# Altium schematic symbol library IC.SchLib: 555 symbols (part 4 of 15)
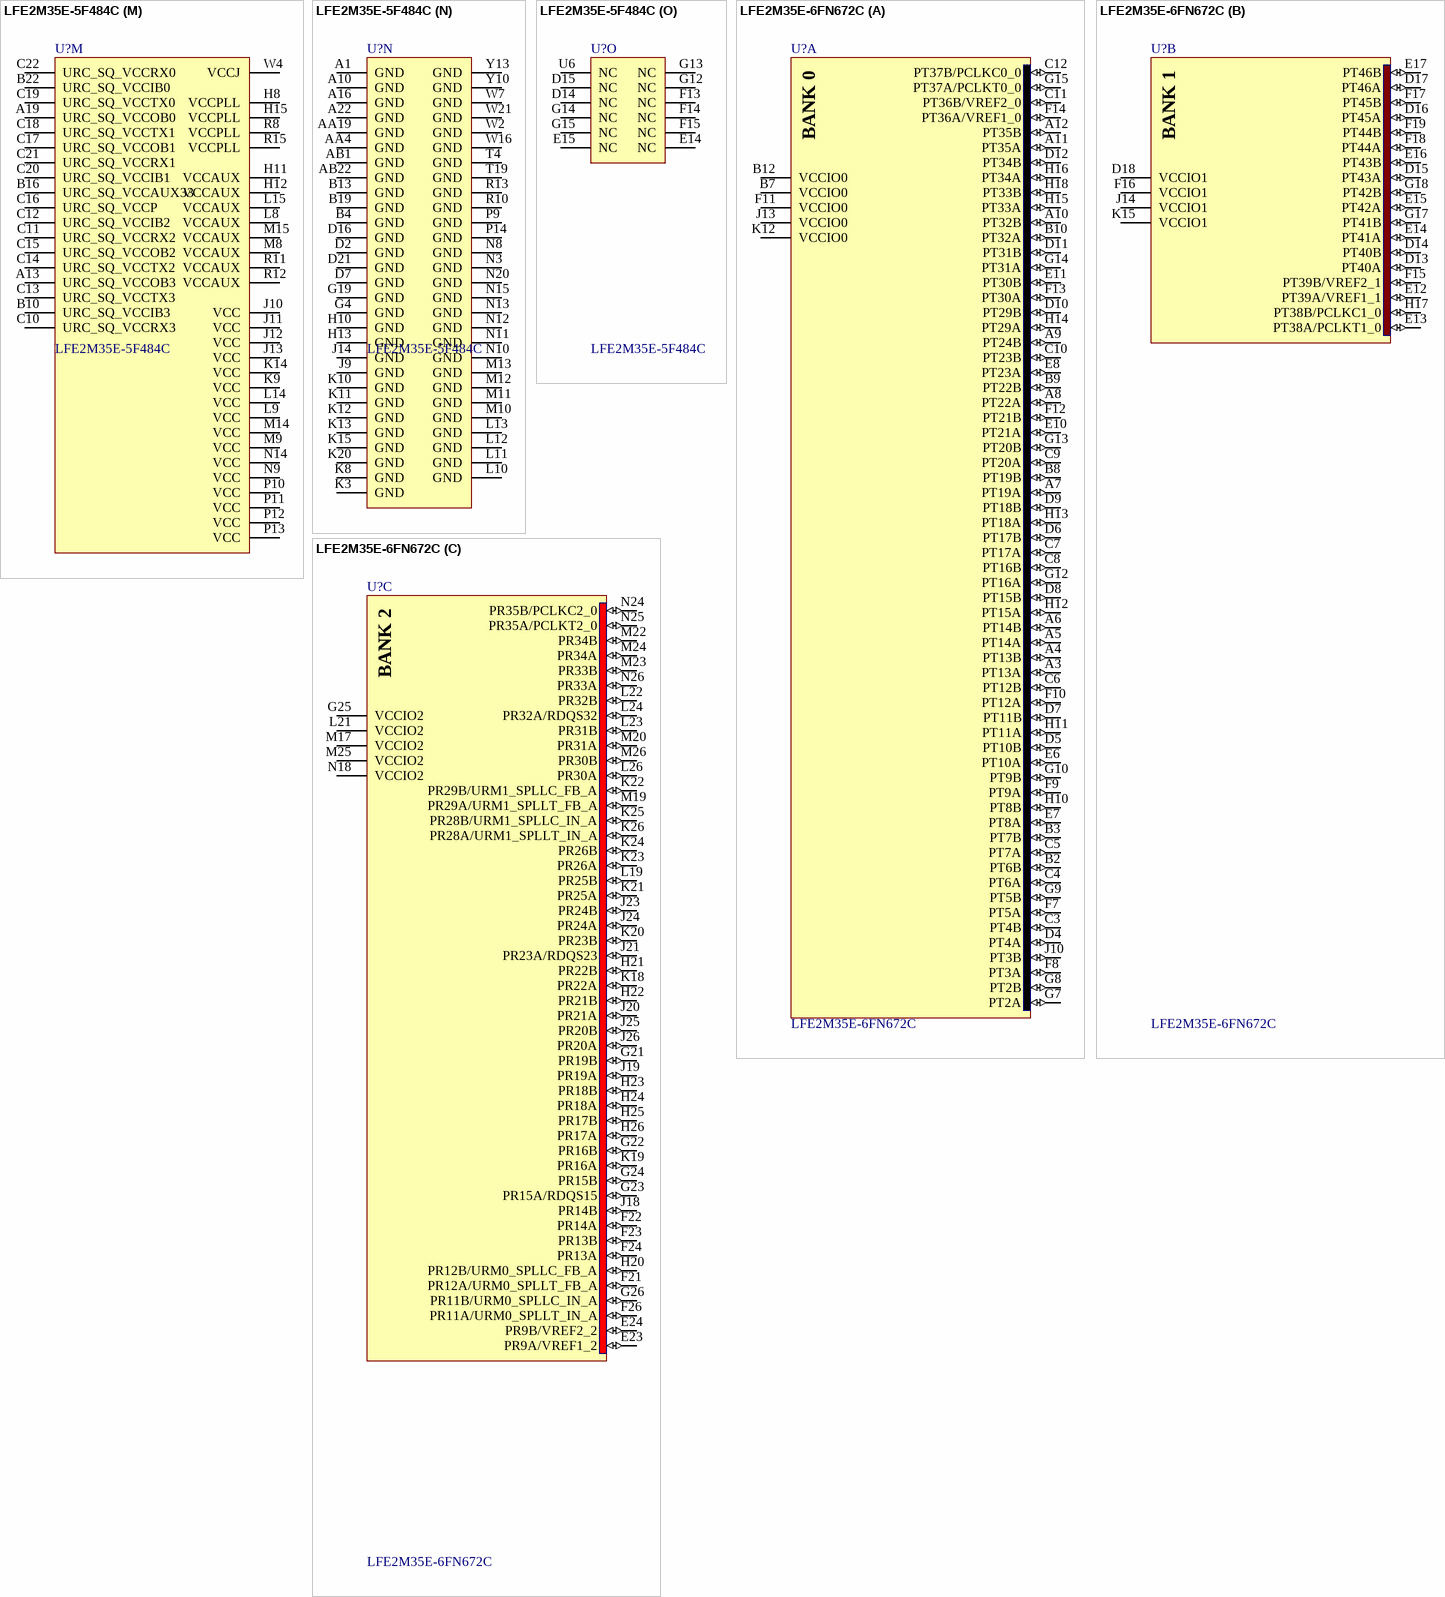
[diagram p73: symbols LFE2M35E-5F484C to LFE2M35E-6FN672C]

## LFE2M35E-5F484C
designator U?
ECP2M 1.2V  FPGA, 303 I/Os, 35K LUTs, 484-Ball fpBGA, Speed Grade 5, Commercial Grade; Manufacturer: Lattice; Tech: SMDR; Sort: 510; Package: FPBGA484; Price: 0; Manufacturer No: LFE2M35E-5F484C
footprint fpBGA484 (484-Ball Fine Pitch Ball Grid Array (fpBGA484))
3D model LFE2M35E_F484 (484-Ball Fine Pitch Ball Grid Array (fpBGA484))
part A pins: A2 PT35B (io) "General-purpose user-I/O pin.", A3 PT35A (io) "General-purpose user-I/O pin.", B1 PT2B (io) "General-purpose user-I/O pin.", B2 PT3A (io) "General-purpose user-I/O pin.", B3 PT34B (io) "General-purpose user-I/O pin.", B5 VCCIO0 (power) "Dedicated power supply pin for I/O bank.", B6 PT32A (io) "General-purpose user-I/O pin.", B9 VCCIO0 (power) "Dedicated power supply pin for I/O bank.", C1 PT2A (io) "General-purpose user-I/O pin.", C2 PT3B (io) "General-purpose user-I/O pin.", C3 PT8B (io) "General-purpose user-I/O pin.", C4 PT34A (io) "General-purpose user-I/O pin.", C5 PT31A (io) "General-purpose user-I/O pin.", C6 PT31B (io) "General-purpose user-I/O pin.", C7 PT32B (io) "General-purpose user-I/O pin.", C8 PT30B (io) "General-purpose user-I/O pin.", C9 PT36B/VREF2_0 (io) "Dual-purpose pin that is either a user-I/O pin or provides a reference voltage input for I/O bank.", D3 PT5B (io) "General-purpose user-I/O pin.", D4 PT8A (io) "General-purpose user-I/O pin.", D5 PT4B (io) "General-purpose user-I/O pin.", D6 PT6A (io) "General-purpose user-I/O pin.", D8 PT30A (io) "General-purpose user-I/O pin.", D9 PT36A/VREF1_0 (io) "Dual-purpose pin that is either a user-I/O pin or provides a reference voltage input for I/O bank.", E3 PT5A (io) "General-purpose user-I/O pin.", E4 PT4A (io) "General-purpose user-I/O pin.", E5 PT6B (io) "General-purpose user-I/O pin.", E6 PT7A (io) "General-purpose user-I/O pin.", E7 VCCIO0 (power) "Dedicated power supply pin for I/O bank.", E8 PT29B (io) "General-purpose user-I/O pin.", E9 PT29A (io) "General-purpose user-I/O pin.", E10 PT33B (io) "General-purpose user-I/O pin.", F6 PT7B (io) "General-purpose user-I/O pin.", F7 PT9B (io) "General-purpose user-I/O pin.", F8 PT10B (io) "General-purpose user-I/O pin.", F9 PT37A/PCLKT0_0 (io) "Dual-purpose pin that is either a user-I/O pin or Primary Clock pin.", F10 PT33A (io) "General-purpose user-I/O pin.", G7 PT9A (io) "General-purpose user-I/O pin.", G8 PT10A (io) "General-purpose user-I/O pin.", G9 PT37B/PCLKC0_0 (io) "Dual-purpose pin that is either a user-I/O pin or Primary Clock pin.", H9 VCCIO0 (power) "Dedicated power supply pin for I/O bank."
part B pins: A4 PT42A (io) "General-purpose user-I/O pin.", A5 PT42B (io) "General-purpose user-I/O pin.", A6 PT44A (io) "General-purpose user-I/O pin.", A7 PT44B (io) "General-purpose user-I/O pin.", A8 PT45A (io) "General-purpose user-I/O pin.", A9 PT45B (io) "General-purpose user-I/O pin.", B7 PT41B (io) "General-purpose user-I/O pin.", B8 PT41A (io) "General-purpose user-I/O pin.", D10 PT39A/VREF1_1 (io) "Dual-purpose pin that is either a user-I/O pin or provides a reference voltage input for I/O bank.", D11 PT39B/VREF2_1 (io) "Dual-purpose pin that is either a user-I/O pin or provides a reference voltage input for I/O bank.", D12 PT46A (io) "General-purpose user-I/O pin.", D13 VCCIO1 (power) "Dedicated power supply pin for I/O bank.", E11 PT40A (io) "General-purpose user-I/O pin.", E12 PT43B (io) "General-purpose user-I/O pin.", E13 PT46B (io) "General-purpose user-I/O pin.", E16 VCCIO1 (power) "Dedicated power supply pin for I/O bank.", F11 PT38A/PCLKT1_0 (io) "Dual-purpose pin that is either a user-I/O pin or Primary Clock pin.", F12 PT43A (io) "General-purpose user-I/O pin.", G10 PT38B/PCLKC1_0 (io) "Dual-purpose pin that is either a user-I/O pin or Primary Clock pin.", G11 PT40B (io) "General-purpose user-I/O pin.", H14 VCCIO1 (power) "Dedicated power supply pin for I/O bank."
part C pins: D18 PR9A/VREF1_2 (io) "Dual-purpose pin that is either a user-I/O pin or provides a reference voltage input for I/O bank.", D19 PR12B/URM0_SPLLC_FB_A (io) "Dual-purpose pin that is either a user-I/O pin or Optional feedback SPLL input pin.", D20 PR13A (io) "General-purpose user-I/O pin.", D22 PR14A (io) "General-purpose user-I/O pin.", E18 PR9B/VREF2_2 (io) "Dual-purpose pin that is either a user-I/O pin or provides a reference voltage input for I/O bank.", E19 PR12A/URM0_SPLLT_FB_A (io) "Dual-purpose pin that is either a user-I/O pin or Optional feedback SPLL input pin.", E20 PR13B (io) "General-purpose user-I/O pin.", E21 VCCIO2 (power) "Dedicated power supply pin for I/O bank.", E22 PR14B (io) "General-purpose user-I/O pin.", F17 PR25A (io) "General-purpose user-I/O pin.", F18 PR11B/URM0_SPLLC_IN_A (io) "Dual-purpose pin that is either a user-I/O pin or SPLL input pin.", F19 PR11A/URM0_SPLLT_IN_A (io) "Dual-purpose pin that is either a user-I/O pin or SPLL input pin.", F20 PR26A (io) "General-purpose user-I/O pin.", F21 PR28A/URM1_SPLLT_IN_A (io) "Dual-purpose pin that is either a user-I/O pin or SPLL input pin.", F22 PR28B/URM1_SPLLC_IN_A (io) "Dual-purpose pin that is either a user-I/O pin or SPLL input pin.", G16 PR29B/URM1_SPLLC_FB_A (io) "Dual-purpose pin that is either a user-I/O pin or Optional feedback SPLL input pin.", G17 PR25B (io) "General-purpose user-I/O pin.", G18 VCCIO2 (power) "Dedicated power supply pin for I/O bank.", G20 PR26B (io) "General-purpose user-I/O pin.", G21 PR31A (io) "General-purpose user-I/O pin.", G22 PR31B (io) "General-purpose user-I/O pin.", H16 PR32B (io) "General-purpose user-I/O pin.", H17 PR32A/RDQS32 (io) "Dual-purpose pin that is either a user-I/O pin or DQS input pin.", H18 PR29A/URM1_SPLLT_FB_A (io) "Dual-purpose pin that is either a user-I/O pin or Optional feedback SPLL input pin.", H19 PR30A (io) "General-purpose user-I/O pin.", H20 PR30B (io) "General-purpose user-I/O pin.", H21 PR35A/PCLKT2_0 (io) "Dual-purpose pin that is either a user-I/O pin or Primary Clock pin.", H22 PR35B/PCLKC2_0 (io) "Dual-purpose pin that is either a user-I/O pin or Primary Clock pin.", J15 VCCIO2 (power) "Dedicated power supply pin for I/O bank.", J17 PR34B (io) "General-purpose user-I/O pin.", J18 PR34A (io) "General-purpose user-I/O pin.", J19 PR33A (io) "General-purpose user-I/O pin.", J20 PR33B (io) "General-purpose user-I/O pin.", K19 VCCIO2 (power) "Dedicated power supply pin for I/O bank."
part D pins: J16 PR38B/VREF2_3 (io) "Dual-purpose pin that is either a user-I/O pin or provides a reference voltage input for I/O bank.", J21 PR37A/PCLKT3_0 (io) "Dual-purpose pin that is either a user-I/O pin or Primary Clock pin.", J22 PR37B/PCLKC3_0 (io) "Dual-purpose pin that is either a user-I/O pin or Primary Clock pin.", K16 PR39B (io) "General-purpose user-I/O pin.", K17 PR39A (io) "General-purpose user-I/O pin.", K18 PR38A/VREF1_3 (io) "Dual-purpose pin that is either a user-I/O pin or provides a reference voltage input for I/O bank.", K21 PR42A/LRM2_SPLLT_FB_A (io) "Dual-purpose pin that is either a user-I/O pin or Optional feedback SPLL input pin.", K22 PR42B/LRM2_SPLLC_FB_A (io) "Dual-purpose pin that is either a user-I/O pin or Optional feedback SPLL input pin.", L16 PR45A (io) "General-purpose user-I/O pin.", L17 PR41B/LRM2_SPLLC_IN_A (io) "Dual-purpose pin that is either a user-I/O pin or SPLL input pin.", L18 PR41A/LRM2_SPLLT_IN_A (io) "Dual-purpose pin that is either a user-I/O pin or SPLL input pin.", L19 PR40A (io) "General-purpose user-I/O pin.", L20 PR40B (io) "General-purpose user-I/O pin.", L21 PR44A (io) "General-purpose user-I/O pin.", L22 PR44B (io) "General-purpose user-I/O pin.", M16 PR47B (io) "General-purpose user-I/O pin.", M17 PR47A (io) "General-purpose user-I/O pin.", M18 PR45B (io) "General-purpose user-I/O pin.", M19 PR46A (io) "General-purpose user-I/O pin.", M20 PR46B (io) "General-purpose user-I/O pin.", M21 PR48A/RDQS48 (io) "Dual-purpose pin that is either a user-I/O pin or DQS input pin.", M22 PR48B (io) "General-purpose user-I/O pin.", N16 PR51A (io) "General-purpose user-I/O pin.", N17 PR49B (io) "General-purpose user-I/O pin.", N18 PR49A (io) "General-purpose user-I/O pin.", N19 VCCIO3 (power) "Dedicated power supply pin for I/O bank.", N21 PR50A (io) "General-purpose user-I/O pin.", N22 PR50B (io) "General-purpose user-I/O pin.", P15 VCCIO3 (power) "Dedicated power supply pin for I/O bank.", P16 PR58B/LRM0_GPLLC_IN_A (io) "Dual-purpose pin that is either a user-I/O pin or GPLL input pin.", P17 PR58A/LRM0_GPLLT_IN_A (io) "Dual-purpose pin that is either a user-I/O pin or GPLL input pin.", P18 PR51B (io) "General-purpose user-I/O pin.", P19 PR57A/LRM0_GPLLT_FB_A/RDQS57 (io) "Multi-purpose pin that is either a user-I/O pin, Optional feedback GPLL input pin or DQS input pin.", P20 PR57B/LRM0_GPLLC_FB_A (io) "Dual-purpose pin that is either a user-I/O pin or Optional feedback GPLL input pin.", P21 PR59A/LRM0_GDLLT_IN_A (io) "Dual-purpose pin that is either a user-I/O pin or DLL input pin.", P22 PR59B/LRM0_GDLLC_IN_A (io) "Dual-purpose pin that is either a user-I/O pin or DLL input pin.", R18 PR60B/LRM0_GDLLC_FB_A (io) "Dual-purpose pin that is either a user-I/O pin or Optional feedback DPLL input pin.", R19 PR60A/LRM0_GDLLT_FB_A (io) "Dual-purpose pin that is either a user-I/O pin or Optional feedback DPLL input pin.", T18 VCCIO3 (power) "Dedicated power supply pin for I/O bank.", V21 VCCIO3 (power) "Dedicated power supply pin for I/O bank."
part E pins: AA8 PB40A/PCLKT4_0 (io) "Dual-purpose pin that is either a user-I/O pin or Primary Clock pin.", AA9 PB41A/VREF2_4 (io) "Dual-purpose pin that is either a user-I/O pin or provides a reference voltage input for I/O bank.", AA10 PB43A (io) "General-purpose user-I/O pin.", AA11 PB49A (io) "General-purpose user-I/O pin.", AA12 PB51A/BDQS51 (io) "Dual-purpose pin that is either a user-I/O pin or DQS input pin.", AA13 PB53B (io) "General-purpose user-I/O pin.", AA14 PB58A (io) "General-purpose user-I/O pin.", AA15 PB60B (io) "General-purpose user-I/O pin.", AA16 PB62B (io) "General-purpose user-I/O pin.", AA17 PB63B (io) "General-purpose user-I/O pin.", AA18 VCCIO4 (power) "Dedicated power supply pin for I/O bank.", AA20 PB66B (io) "General-purpose user-I/O pin.", AA21 PB66A (io) "General-purpose user-I/O pin.", AB8 PB40B/PCLKC4_0 (io) "Dual-purpose pin that is either a user-I/O pin or Primary Clock pin.", AB9 PB42A/BDQS42 (io) "Dual-purpose pin that is either a user-I/O pin or DQS input pin.", AB10 PB42B (io) "General-purpose user-I/O pin.", AB11 PB49B (io) "General-purpose user-I/O pin.", AB12 PB53A (io) "General-purpose user-I/O pin.", AB13 PB56A (io) "General-purpose user-I/O pin.", AB14 PB56B (io) "General-purpose user-I/O pin.", AB15 PB60A/BDQS60 (io) "Dual-purpose pin that is either a user-I/O pin or DQS input pin.", AB16 PB62A (io) "General-purpose user-I/O pin.", AB17 PB63A (io) "General-purpose user-I/O pin.", AB18 PB67B (io) "General-purpose user-I/O pin.", AB19 PB67A (io) "General-purpose user-I/O pin.", AB20 PB65A (io) "General-purpose user-I/O pin.", AB21 PB65B (io) "General-purpose user-I/O pin.", R14 VCCIO4 (power) "Dedicated power supply pin for I/O bank.", T11 PB50A (io) "General-purpose user-I/O pin.", T12 PB54A (io) "General-purpose user-I/O pin.", T13 PB55B (io) "General-purpose user-I/O pin.", T14 PB57B (io) "General-purpose user-I/O pin.", U11 PB47B (io) "General-purpose user-I/O pin.", U12 PB50B (io) "General-purpose user-I/O pin.", U13 PB54B (io) "General-purpose user-I/O pin.", U14 PB57A (io) "General-purpose user-I/O pin.", U15 PB61B (io) "General-purpose user-I/O pin.", V10 PB47A (io) "General-purpose user-I/O pin.", V11 PB48A (io) "General-purpose user-I/O pin.", V12 PB52A (io) "General-purpose user-I/O pin.", V13 PB55A (io) "General-purpose user-I/O pin.", V14 PB59B (io) "General-purpose user-I/O pin.", V15 PB61A (io) "General-purpose user-I/O pin.", V16 VCCIO4 (power) "Dedicated power supply pin for I/O bank.", V17 PB73A (io) "General-purpose user-I/O pin.", V18 PB73B (io) "General-purpose user-I/O pin.", W11 PB48B (io) "General-purpose user-I/O pin.", W12 PB52B (io) "General-purpose user-I/O pin.", W13 VCCIO4 (power) "Dedicated power supply pin for I/O bank.", W14 PB59A (io) "General-purpose user-I/O pin.", W15 PB64B (io) "General-purpose user-I/O pin.", W17 PB70B (io) "General-purpose user-I/O pin.", W18 PB72B (io) "General-purpose user-I/O pin.", W19 PB72A (io) "General-purpose user-I/O pin.", Y9 PB41B/VREF1_4 (io) "Dual-purpose pin that is either a user-I/O pin or provides a reference voltage input for I/O bank.", Y11 PB43B (io) "General-purpose user-I/O pin.", Y12 PB51B (io) "General-purpose user-I/O pin.", Y14 PB58B (io) "General-purpose user-I/O pin.", Y15 PB64A (io) "General-purpose user-I/O pin.", Y16 PB70A (io) "General-purpose user-I/O pin.", Y17 PB69A/BDQS69 (io) "Dual-purpose pin that is either a user-I/O pin or DQS input pin.", Y18 PB69B (io) "General-purpose user-I/O pin.", Y19 PB71A (io) "General-purpose user-I/O pin.", Y20 PB71B (io) "General-purpose user-I/O pin.", Y21 PB68B (io) "General-purpose user-I/O pin.", Y22 PB68A (io) "General-purpose user-I/O pin."
part F pins: AA3 PB4A (io) "General-purpose user-I/O pin.", AA5 VCCIO5 (power) "Dedicated power supply pin for I/O bank.", AA6 PB10B (io) "General-purpose user-I/O pin.", AA7 PB34A/VREF2_5 (io) "Dual-purpose pin that is either a user-I/O pin or provides a reference voltage input for I/O bank.", AB2 PB4B (io) "General-purpose user-I/O pin.", AB3 PB9A (io) "General-purpose user-I/O pin.", AB4 PB9B (io) "General-purpose user-I/O pin.", AB5 PB10A (io) "General-purpose user-I/O pin.", AB6 PB35A/PCLKT5_0 (io) "Dual-purpose pin that is either a user-I/O pin or Primary Clock pin.", AB7 PB35B/PCLKC5_0 (io) "Dual-purpose pin that is either a user-I/O pin or Primary Clock pin.", R9 VCCIO5 (power) "Dedicated power supply pin for I/O bank.", T8 PB5A (io) "General-purpose user-I/O pin.", T9 PB6B (io) "General-purpose user-I/O pin.", T10 PB32B (io) "General-purpose user-I/O pin.", U7 PB5B (io) "General-purpose user-I/O pin.", U8 PB6A/BDQS6 (io) "Dual-purpose pin that is either a user-I/O pin or DQS input pin.", U9 PB31B (io) "General-purpose user-I/O pin.", U10 PB32A (io) "General-purpose user-I/O pin.", V6 PB3B (io) "General-purpose user-I/O pin.", V7 VCCIO5 (power) "Dedicated power supply pin for I/O bank.", V8 PB7A (io) "General-purpose user-I/O pin.", V9 PB31A (io) "General-purpose user-I/O pin.", W5 PB2A (io) "General-purpose user-I/O pin.", W6 PB3A (io) "General-purpose user-I/O pin.", W8 PB7B (io) "General-purpose user-I/O pin.", W9 PB33A/BDQS33 (io) "Dual-purpose pin that is either a user-I/O pin or DQS input pin.", W10 VCCIO5 (power) "Dedicated power supply pin for I/O bank.", Y4 PB2B (io) "General-purpose user-I/O pin.", Y5 PB8B (io) "General-purpose user-I/O pin.", Y6 PB8A (io) "General-purpose user-I/O pin.", Y7 PB34B/VREF1_5 (io) "Dual-purpose pin that is either a user-I/O pin or provides a reference voltage input for I/O bank.", Y8 PB33B (io) "General-purpose user-I/O pin."
part G pins: AA1 PL69A (io) "General-purpose user-I/O pin.", AA2 PL69B (io) "General-purpose user-I/O pin.", M3 PL38A/VREF2_6 (io) "Dual-purpose pin that is either a user-I/O pin or provides a reference voltage input for I/O bank.", M4 PL38B/VREF1_6 (io) "Dual-purpose pin that is either a user-I/O pin or provides a reference voltage input for I/O bank.", M5 PL37B/PCLKC6_0 (io) "Dual-purpose pin that is either a user-I/O pin or Primary Clock pin.", M6 PL37A/PCLKT6_0 (io) "Dual-purpose pin that is either a user-I/O pin or Primary Clock pin.", N1 PL42A/LLM2_SPLLT_FB_A (io) "Dual-purpose pin that is either a user-I/O pin or Optional feedback SPLL input pin.", N2 PL42B/LLM2_SPLLC_FB_A (io) "Dual-purpose pin that is either a user-I/O pin or Optional feedback SPLL input pin.", N4 VCCIO6 (power) "Dedicated power supply pin for I/O bank.", N5 PL48B (io) "General-purpose user-I/O pin.", N6 PL41B/LLM2_SPLLC_IN_A (io) "Dual-purpose pin that is either a user-I/O pin or SPLL input pin.", N7 PL41A/LLM2_SPLLT_IN_A (io) "Dual-purpose pin that is either a user-I/O pin or SPLL input pin.", P1 PL49A (io) "General-purpose user-I/O pin.", P2 PL49B (io) "General-purpose user-I/O pin.", P3 PL50A (io) "General-purpose user-I/O pin.", P4 PL50B (io) "General-purpose user-I/O pin.", P5 PL51A (io) "General-purpose user-I/O pin.", P6 PL48A/LDQS48 (io) "Dual-purpose pin that is either a user-I/O pin or DQS input pin.", P7 PL51B (io) "General-purpose user-I/O pin.", P8 VCCIO6 (power) "Dedicated power supply pin for I/O bank.", R1 PL57A/LLM0_GPLLT_IN_A/LDQS57 (io) "Multi-purpose pin that is either a user-I/O pin, GPLL input pin or DQS input pin.", R2 PL57B/LLM0_GPLLC_IN_A (io) "Dual-purpose pin that is either a user-I/O pin or GPLL input pin.", R3 PL58A/LLM0_GPLLT_FB_A (io) "Dual-purpose pin that is either a user-I/O pin or Optional feedback GPLL input pin.", R4 PL58B/LLM0_GPLLC_FB_A (io) "Dual-purpose pin that is either a user-I/O pin or Optional feedback GPLL input pin.", R5 PL59B/LLM0_GDLLC_IN_A (io) "Dual-purpose pin that is either a user-I/O pin or DLL input pin.", R6 PL59A/LLM0_GDLLT_IN_A (io) "Dual-purpose pin that is either a user-I/O pin or DLL input pin.", T1 PL60A/LLM0_GDLLT_FB_A (io) "Dual-purpose pin that is either a user-I/O pin or Optional feedback DPLL input pin.", T2 PL60B/LLM0_GDLLC_FB_A (io) "Dual-purpose pin that is either a user-I/O pin or Optional feedback DPLL input pin.", T3 PL64A (io) "General-purpose user-I/O pin.", T5 VCCIO6 (power) "Dedicated power supply pin for I/O bank.", T6 PL62A (io) "General-purpose user-I/O pin.", T7 PL62B (io) "General-purpose user-I/O pin.", U1 PL63A (io) "General-purpose user-I/O pin.", U2 PL63B (io) "General-purpose user-I/O pin.", U3 PL64B (io) "General-purpose user-I/O pin.", U4 PL66B (io) "General-purpose user-I/O pin.", U5 PL65B (io) "General-purpose user-I/O pin.", V1 PL67A (io) "General-purpose user-I/O pin.", V2 VCCIO6 (power) "Dedicated power supply pin for I/O bank.", V3 PL67B (io) "General-purpose user-I/O pin.", V5 PL66A/LDQS66 (io) "Dual-purpose pin that is either a user-I/O pin or DQS input pin.", W1 PL68A (io) "General-purpose user-I/O pin.", Y1 PL68B (io) "General-purpose user-I/O pin."
part H pins: D1 PL2A (io) "General-purpose user-I/O pin.", E1 PL2B (io) "General-purpose user-I/O pin.", E2 VCCIO7 (power) "Dedicated power supply pin for I/O bank.", F1 PL3A (io) "General-purpose user-I/O pin.", F2 PL3B (io) "General-purpose user-I/O pin.", F3 PL5B (io) "General-purpose user-I/O pin.", F4 PL5A (io) "General-purpose user-I/O pin.", F5 PL4A (io) "General-purpose user-I/O pin.", G1 PL6A/LDQS6 (io) "Dual-purpose pin that is either a user-I/O pin or DQS input pin.", G2 PL6B (io) "General-purpose user-I/O pin.", G3 PL9A/VREF2_7 (io) "Dual-purpose pin that is either a user-I/O pin or provides a reference voltage input for I/O bank.", G5 VCCIO7 (power) "Dedicated power supply pin for I/O bank.", G6 PL4B (io) "General-purpose user-I/O pin.", H1 PL7A (io) "General-purpose user-I/O pin.", H2 PL7B (io) "General-purpose user-I/O pin.", H3 PL9B/VREF1_7 (io) "Dual-purpose pin that is either a user-I/O pin or provides a reference voltage input for I/O bank.", H4 PL11B/ULM0_SPLLC_IN_A (io) "Dual-purpose pin that is either a user-I/O pin or SPLL input pin.", H5 PL11A/ULM0_SPLLT_IN_A (io) "Dual-purpose pin that is either a user-I/O pin or SPLL input pin.", H6 PL8B (io) "General-purpose user-I/O pin.", H7 PL8A (io) "General-purpose user-I/O pin.", J1 PL12A/ULM0_SPLLT_FB_A (io) "Dual-purpose pin that is either a user-I/O pin or Optional feedback SPLL input pin.", J2 PL12B/ULM0_SPLLC_FB_A (io) "Dual-purpose pin that is either a user-I/O pin or Optional feedback SPLL input pin.", J3 PL13A (io) "General-purpose user-I/O pin.", J4 PL13B (io) "General-purpose user-I/O pin.", J5 PL29A/ULM1_SPLLT_FB_A (io) "Dual-purpose pin that is either a user-I/O pin or Optional feedback SPLL input pin.", J6 PL14B (io) "General-purpose user-I/O pin.", J7 PL14A (io) "General-purpose user-I/O pin.", J8 VCCIO7 (power) "Dedicated power supply pin for I/O bank.", K1 PL28A/ULM1_SPLLT_IN_A (io) "Dual-purpose pin that is either a user-I/O pin or SPLL input pin.", K2 PL28B/ULM1_SPLLC_IN_A (io) "Dual-purpose pin that is either a user-I/O pin or SPLL input pin.", K4 VCCIO7 (power) "Dedicated power supply pin for I/O bank.", K5 PL29B/ULM1_SPLLC_FB_A (io) "Dual-purpose pin that is either a user-I/O pin or Optional feedback SPLL input pin.", K6 PL30B (io) "General-purpose user-I/O pin.", K7 PL30A (io) "General-purpose user-I/O pin.", L1 PL32A/LDQS32 (io) "Dual-purpose pin that is either a user-I/O pin or DQS input pin.", L2 PL32B (io) "General-purpose user-I/O pin.", L3 PL34A (io) "General-purpose user-I/O pin.", L4 PL34B (io) "General-purpose user-I/O pin.", L5 PL33B (io) "General-purpose user-I/O pin.", L6 PL31A (io) "General-purpose user-I/O pin.", L7 PL31B (io) "General-purpose user-I/O pin.", M1 PL35A/PCLKT7_0 (io) "Dual-purpose pin that is either a user-I/O pin or Primary Clock pin.", M2 PL35B/PCLKC7_0 (io) "Dual-purpose pin that is either a user-I/O pin or Primary Clock pin.", M7 PL33A (io) "General-purpose user-I/O pin."
part I pins: AA22 VCCIO8 (power) "Dedicated power supply pin for I/O bank.", R17 PR64A/D6 (io) "Dual-purpose pin that is either a user-I/O pin or sysCONFIG Port Data I/O.", R20 PR62A/BUSY (io) "Dual-purpose configuration pin. Read control command in SPI3 or SPIX mode and available as a user-I/O.", R21 PR62B/DOUT/CSON (io) "Dual-purpose configuration pin. Output for serial configuration data and available as a user-I/O pin.", R22 PR65A/D4 (io) "Dual-purpose pin that is either a user-I/O pin or sysCONFIG Port Data I/O.", T15 PR64B/D5 (io) "Dual-purpose pin that is either a user-I/O pin or sysCONFIG Port Data I/O.", T16 PR66B/D1 (io) "Dual-purpose pin that is either a user-I/O pin or sysCONFIG Port Data I/O.", T17 PR66A/D2 (io) "Dual-purpose pin that is either a user-I/O pin or sysCONFIG Port Data I/O.", T20 PR63B/D7 (io) "Dual-purpose pin that is either a user-I/O pin or sysCONFIG Port Data I/O.", T21 PR63A/DI (io) "Dual-purpose pin that is either a user-I/O pin or Input for serial configuration data when using sysCONFIG port.", T22 PR65B/D3 (io) "Dual-purpose pin that is either a user-I/O pin or sysCONFIG Port Data I/O.", U16 PR67A/D0 (io) "Dual-purpose pin that is either a user-I/O pin or sysCONFIG Port Data I/O.", U17 PR67B/CSN (io) "Dual-purpose configuration pin. sysCONFIG chip select and available as a user-I/O pin.", U19 VCCIO8 (power) "Dedicated power supply pin for I/O bank.", U20 PR68B/WRITEN (io) "Dual-purpose configuration pin. Write Data on Parallel port and available as a user-I/O pin.", U21 PR68A/CS1N (io) "Dual-purpose configuration pin. sysCONFIG chip select and available as a user-I/O pin."
part J pins: F16 XRES "10K ohm +/-1% resistor must be connected between this pin and ground.", R7 LLM0_PLLCAP "External capacitor connection for PLL.", R16 LRM0_PLLCAP "External capacitor connection for PLL."
part K pins: U18 INITN (io) "Dedicated configuration pin. Indicates FPGA ready to be configured.", U22 DONE (io) "Dedicated configuration pin. Indicates configuration sequence complete & startup sequence in progress.", V4 TCK (in) "Dedicated JTAG pin. Test Clock.", V19 CFG0 (in) "Dedicated configuration pin. Specifies configuration mode values latched on rising edge of INITN.", V20 CFG1 (in) "Dedicated configuration pin. Specifies configuration mode values latched on rising edge of INITN.", V22 PROGRAMN (in) "Dedicated configuration pin. Initiates configuration sequence when asserted low.", W3 TDO (out) "Dedicated JTAG pin. Test Data Output.", W20 CFG2 (in) "Dedicated configuration pin. Specifies configuration mode values latched on rising edge of INITN.", W22 CCLK (io) "Configuration Clock for configuring an FPGA in sysCONFIG mode.", Y2 TDI (in) "Dedicated JTAG pin. Test Data Input.", Y3 TMS (in) "Dedicated JTAG pin. Test Mode Select"
part L pins: A11 URC_SQ_HDINP3 (in) "Dedicated SERDES pin. High-speed input, positive channel.", A12 URC_SQ_HDINP2 (in) "Dedicated SERDES pin. High-speed input, positive channel.", A14 URC_SQ_HDOUTP3 (out) "Dedicated SERDES pin. High-speed output, positive channel.", A15 URC_SQ_HDOUTP2 (out) "Dedicated SERDES pin. High-speed output, positive channel.", A17 URC_SQ_HDOUTP1 (out) "Dedicated SERDES pin. High-speed output, positive channel.", A18 URC_SQ_HDOUTP0 (out) "Dedicated SERDES pin. High-speed output, positive channel.", A20 URC_SQ_HDINP1 (in) "Dedicated SERDES pin. High-speed input, positive channel.", A21 URC_SQ_HDINP0 (in) "Dedicated SERDES pin. High-speed input, positive channel.", B11 URC_SQ_HDINN3 (in) "Dedicated SERDES pin. High-speed input, negative channel.", B12 URC_SQ_HDINN2 (in) "Dedicated SERDES pin. High-speed input, negative channel.", B14 URC_SQ_HDOUTN3 (out) "Dedicated SERDES pin. High-speed output, negative channel.", B15 URC_SQ_HDOUTN2 (out) "Dedicated SERDES pin. High-speed output, negative channel.", B17 URC_SQ_HDOUTN1 (out) "Dedicated SERDES pin. High-speed output, negative channel.", B18 URC_SQ_HDOUTN0 (out) "Dedicated SERDES pin. High-speed output, negative channel.", B20 URC_SQ_HDINN1 (in) "Dedicated SERDES pin. High-speed input, negative channel.", B21 URC_SQ_HDINN0 (in) "Dedicated SERDES pin. High-speed input, negative channel.", D17 URC_SQ_REFCLKP (in) "Dedicated SERDES pin. Positive Reference Clock Input.", E17 URC_SQ_REFCLKN (in) "Dedicated SERDES pin. Negative Reference Clock Input."
part M pins: A13 URC_SQ_VCCOB3 (power) "Dedicated SERDES pin. Output buffer power supply.", A19 URC_SQ_VCCOB0 (power) "Dedicated SERDES pin. Output buffer power supply.", B10 URC_SQ_VCCIB3 (power) "Dedicated SERDES pin. Input buffer power supply.", B16 URC_SQ_VCCAUX33 (power) "Dedicated SERDES pin. Termination resistor switching power.", B22 URC_SQ_VCCIB0 (power) "Dedicated SERDES pin. Input buffer power supply.", C10 URC_SQ_VCCRX3 (power) "Dedicated SERDES pin. Receiver power supply.", C11 URC_SQ_VCCRX2 (power) "Dedicated SERDES pin. Receiver power supply.", C12 URC_SQ_VCCIB2 (power) "Dedicated SERDES pin. Input buffer power supply.", C13 URC_SQ_VCCTX3 (power) "Dedicated SERDES pin. Transmitter power supply.", C14 URC_SQ_VCCTX2 (power) "Dedicated SERDES pin. Transmitter power supply.", C15 URC_SQ_VCCOB2 (power) "Dedicated SERDES pin. Output buffer power supply.", C16 URC_SQ_VCCP (power) "Dedicated SERDES pin. PLL and Reference clock buffer power.", C17 URC_SQ_VCCOB1 (power) "Dedicated SERDES pin. Output buffer power supply.", C18 URC_SQ_VCCTX1 (power) "Dedicated SERDES pin. Transmitter power supply.", C19 URC_SQ_VCCTX0 (power) "Dedicated SERDES pin. Transmitter power supply.", C20 URC_SQ_VCCIB1 (power) "Dedicated SERDES pin. Input buffer power supply.", C21 URC_SQ_VCCRX1 (power) "Dedicated SERDES pin. Receiver power supply.", C22 URC_SQ_VCCRX0 (power) "Dedicated SERDES pin. Receiver power supply.", H8 VCCPLL (power) "PLL Supply Voltage.", H11 VCCAUX (power) "Dedicated auxiliary power supply pin.", H12 VCCAUX (power) "Dedicated auxiliary power supply pin.", H15 VCCPLL (power) "PLL Supply Voltage.", J10 VCC (power) "Dedicated core logic power supply pin.", J11 VCC (power) "Dedicated core logic power supply pin.", J12 VCC (power) "Dedicated core logic power supply pin.", J13 VCC (power) "Dedicated core logic power supply pin.", K9 VCC (power) "Dedicated core logic power supply pin.", K14 VCC (power) "Dedicated core logic power supply pin.", L8 VCCAUX (power) "Dedicated auxiliary power supply pin.", L9 VCC (power) "Dedicated core logic power supply pin.", L14 VCC (power) "Dedicated core logic power supply pin.", L15 VCCAUX (power) "Dedicated auxiliary power supply pin.", M8 VCCAUX (power) "Dedicated auxiliary power supply pin.", M9 VCC (power) "Dedicated core logic power supply pin.", M14 VCC (power) "Dedicated core logic power supply pin.", M15 VCCAUX (power) "Dedicated auxiliary power supply pin.", N9 VCC (power) "Dedicated core logic power supply pin.", N14 VCC (power) "Dedicated core logic power supply pin.", P10 VCC (power) "Dedicated core logic power supply pin.", P11 VCC (power) "Dedicated core logic power supply pin.", P12 VCC (power) "Dedicated core logic power supply pin.", P13 VCC (power) "Dedicated core logic power supply pin.", R8 VCCPLL (power) "PLL Supply Voltage.", R11 VCCAUX (power) "Dedicated auxiliary power supply pin.", R12 VCCAUX (power) "Dedicated auxiliary power supply pin.", R15 VCCPLL (power) "PLL Supply Voltage.", W4 VCCJ (power) "Power supply for JTAG Test Access Port."
part N pins: A1 GND (power) "Dedicated ground pin.", A10 GND (power) "Dedicated ground pin.", A16 GND (power) "Dedicated ground pin.", A22 GND (power) "Dedicated ground pin.", AA4 GND (power) "Dedicated ground pin.", AA19 GND (power) "Dedicated ground pin.", AB1 GND (power) "Dedicated ground pin.", AB22 GND (power) "Dedicated ground pin.", B4 GND (power) "Dedicated ground pin.", B13 GND (power) "Dedicated ground pin.", B19 GND (power) "Dedicated ground pin.", D2 GND (power) "Dedicated ground pin.", D7 GND (power) "Dedicated ground pin.", D16 GND (power) "Dedicated ground pin.", D21 GND (power) "Dedicated ground pin.", G4 GND (power) "Dedicated ground pin.", G19 GND (power) "Dedicated ground pin.", H10 GND (power) "Dedicated ground pin.", H13 GND (power) "Dedicated ground pin.", J9 GND (power) "Dedicated ground pin.", J14 GND (power) "Dedicated ground pin.", K3 GND (power) "Dedicated ground pin.", K8 GND (power) "Dedicated ground pin.", K10 GND (power) "Dedicated ground pin.", K11 GND (power) "Dedicated ground pin.", K12 GND (power) "Dedicated ground pin.", K13 GND (power) "Dedicated ground pin.", K15 GND (power) "Dedicated ground pin.", K20 GND (power) "Dedicated ground pin.", L10 GND (power) "Dedicated ground pin.", L11 GND (power) "Dedicated ground pin.", L12 GND (power) "Dedicated ground pin.", L13 GND (power) "Dedicated ground pin.", M10 GND (power) "Dedicated ground pin.", M11 GND (power) "Dedicated ground pin.", M12 GND (power) "Dedicated ground pin.", M13 GND (power) "Dedicated ground pin.", N3 GND (power) "Dedicated ground pin.", N8 GND (power) "Dedicated ground pin.", N10 GND (power) "Dedicated ground pin.", N11 GND (power) "Dedicated ground pin.", N12 GND (power) "Dedicated ground pin.", N13 GND (power) "Dedicated ground pin.", N15 GND (power) "Dedicated ground pin.", N20 GND (power) "Dedicated ground pin.", P9 GND (power) "Dedicated ground pin.", P14 GND (power) "Dedicated ground pin.", R10 GND (power) "Dedicated ground pin.", R13 GND (power) "Dedicated ground pin.", T4 GND (power) "Dedicated ground pin.", T19 GND (power) "Dedicated ground pin.", W2 GND (power) "Dedicated ground pin.", W7 GND (power) "Dedicated ground pin.", W16 GND (power) "Dedicated ground pin.", W21 GND (power) "Dedicated ground pin.", Y10 GND (power) "Dedicated ground pin.", Y13 GND (power) "Dedicated ground pin."
part O pins: D14 NC "Not Connected", D15 NC "Not Connected", E14 NC "Not Connected", E15 NC "Not Connected", F13 NC "Not Connected", F14 NC "Not Connected", F15 NC "Not Connected", G12 NC "Not Connected", G13 NC "Not Connected", G14 NC "Not Connected", G15 NC "Not Connected", U6 NC "Not Connected"
part A text: BANK 0
part B text: BANK 1
part C text: BANK 2
part D text: BANK 3
part E text: BANK 4
part F text: BANK 5
part G text: BANK 6
part H text: BANK 7
part I text: BANK 8

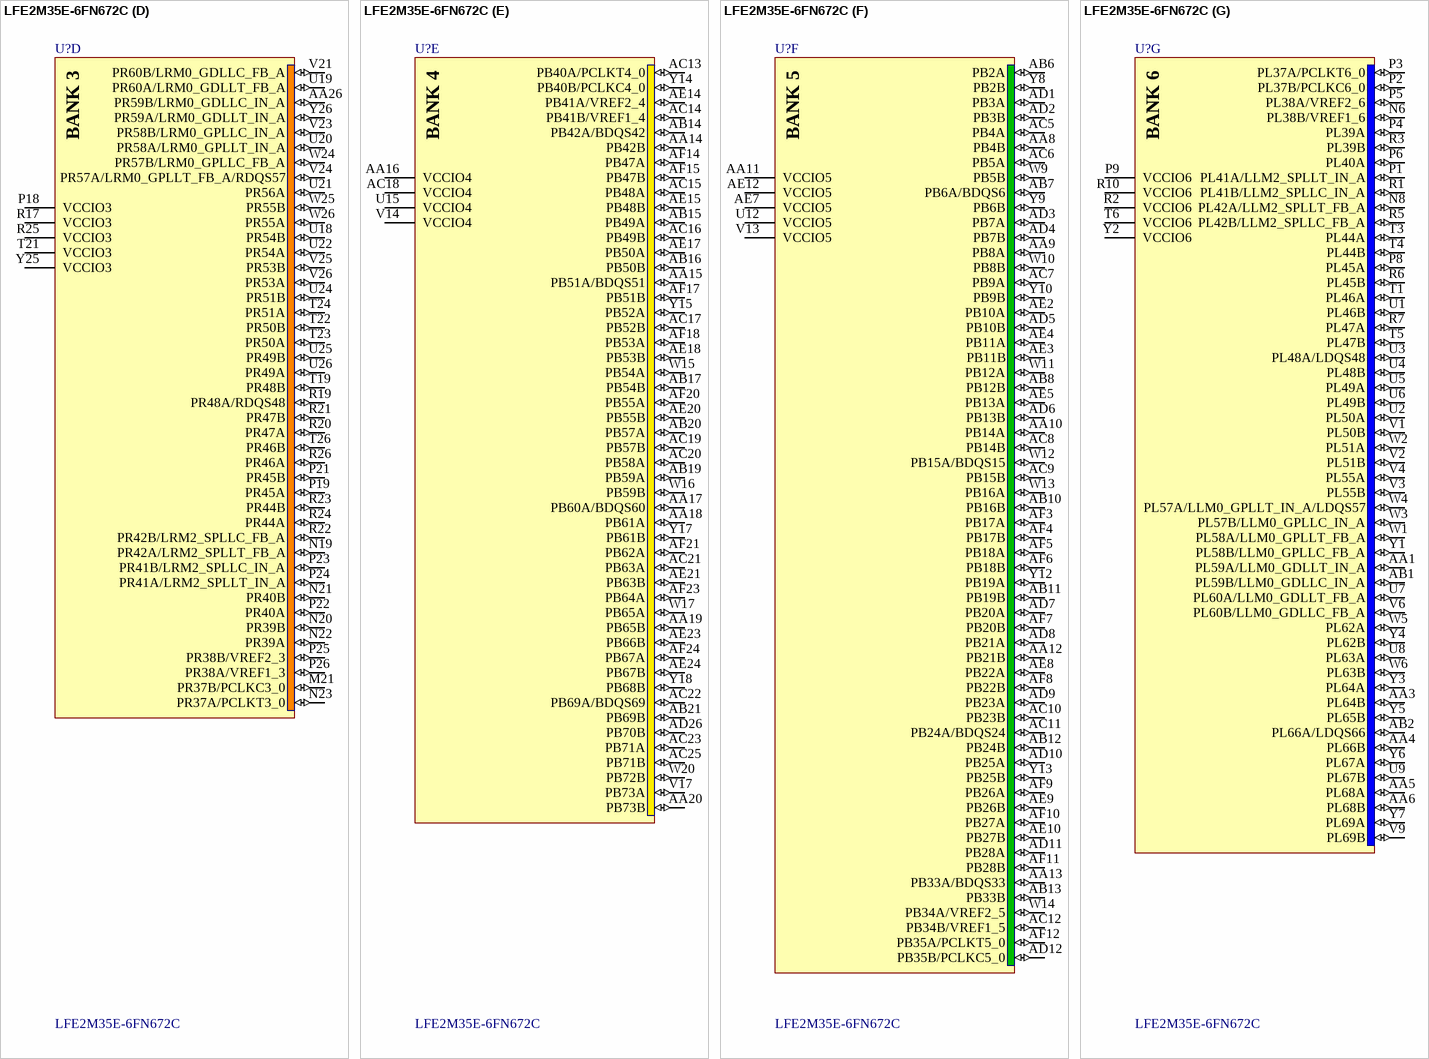
[diagram p15: symbol LFE2M35E-6FN672C]

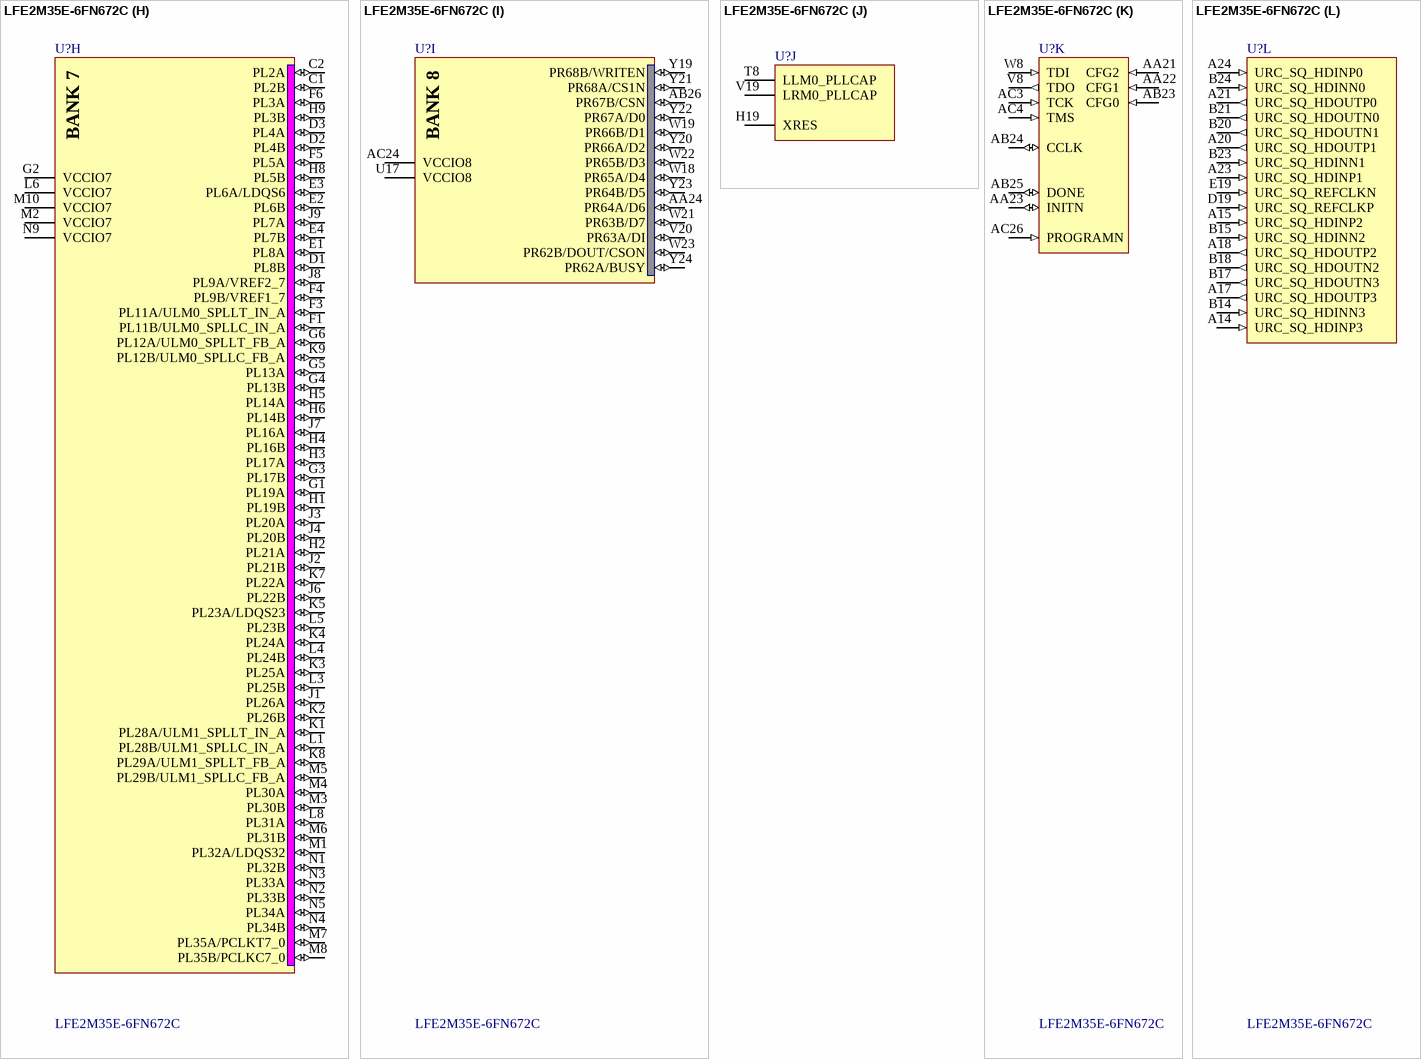
[diagram p16: symbol LFE2M35E-6FN672C]

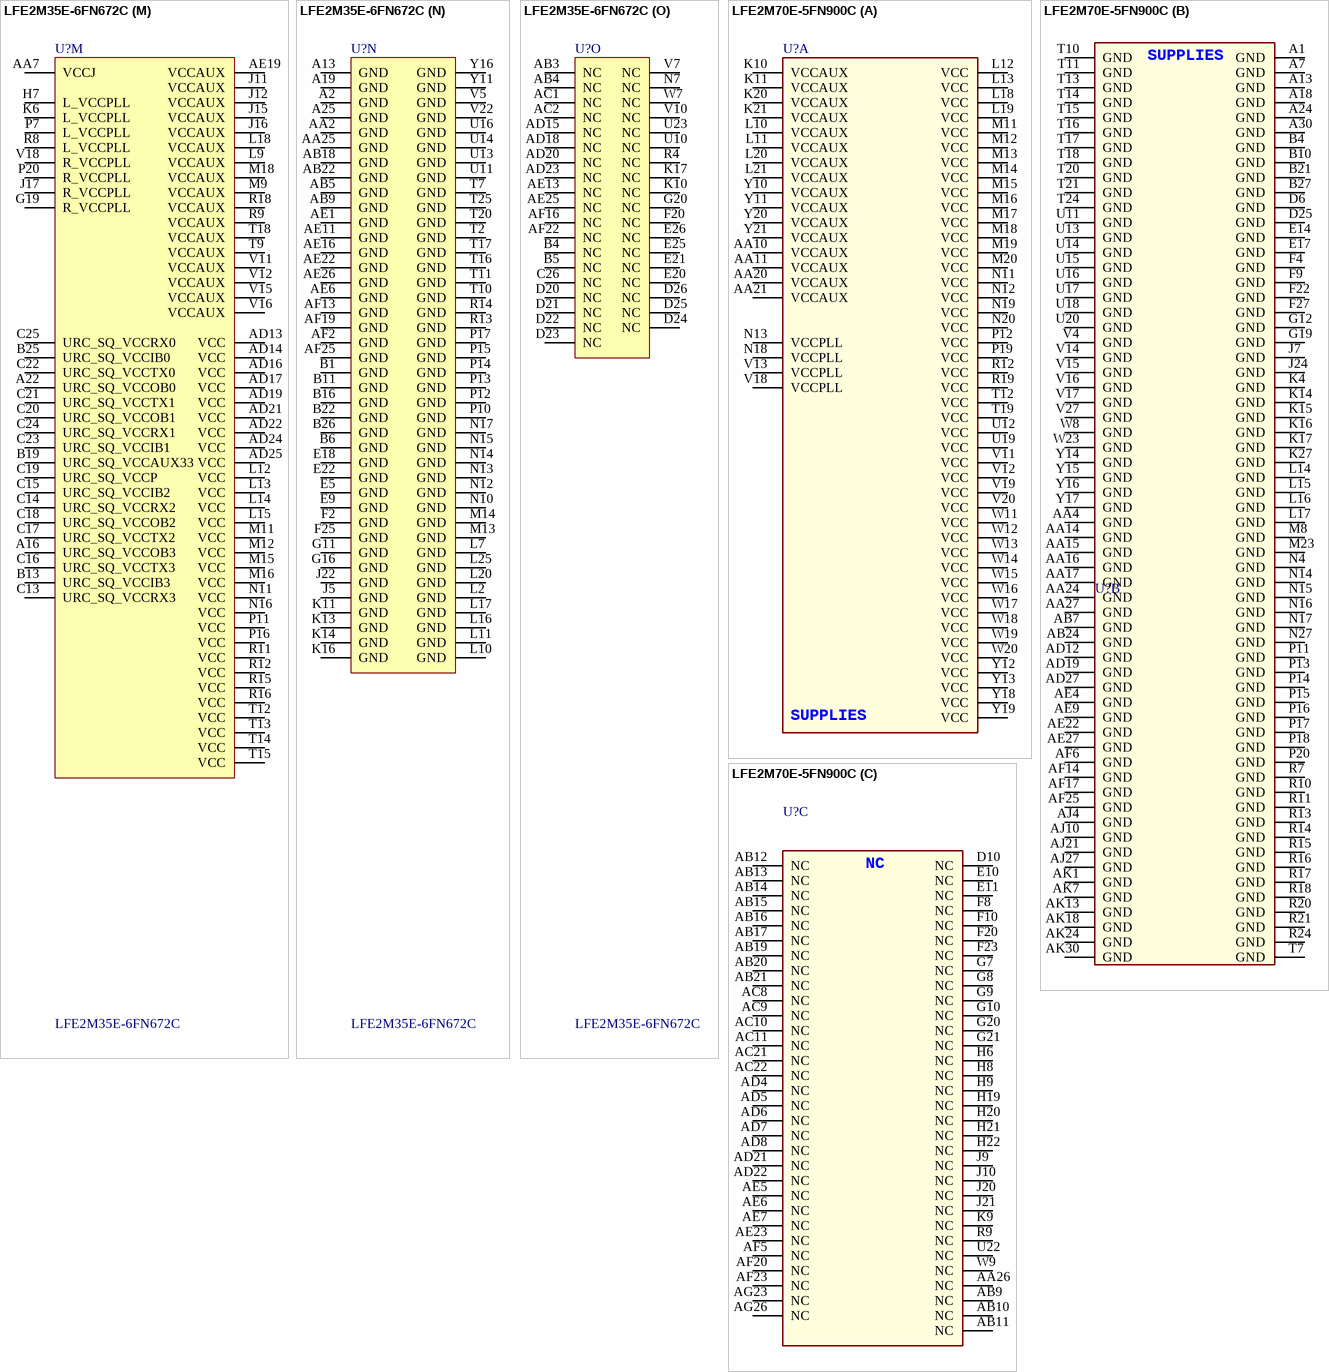
[diagram p17: symbols LFE2M35E-6FN672C to LFE2M70E-5FN900C]